# Altium footprint library JEDEC_G.PcbLib: 194 footprints (part 1 of 13)
Each footprint in its own frame and in the unit in brackets; x right, y up, seen from the top. Pads: shape width x height; smd on the part's side, far side on the other; paste and mask are expansions set on the pad; w line width, h text height; cw(c..) or ccw(c..) is an arc to the next point about the centre after c.
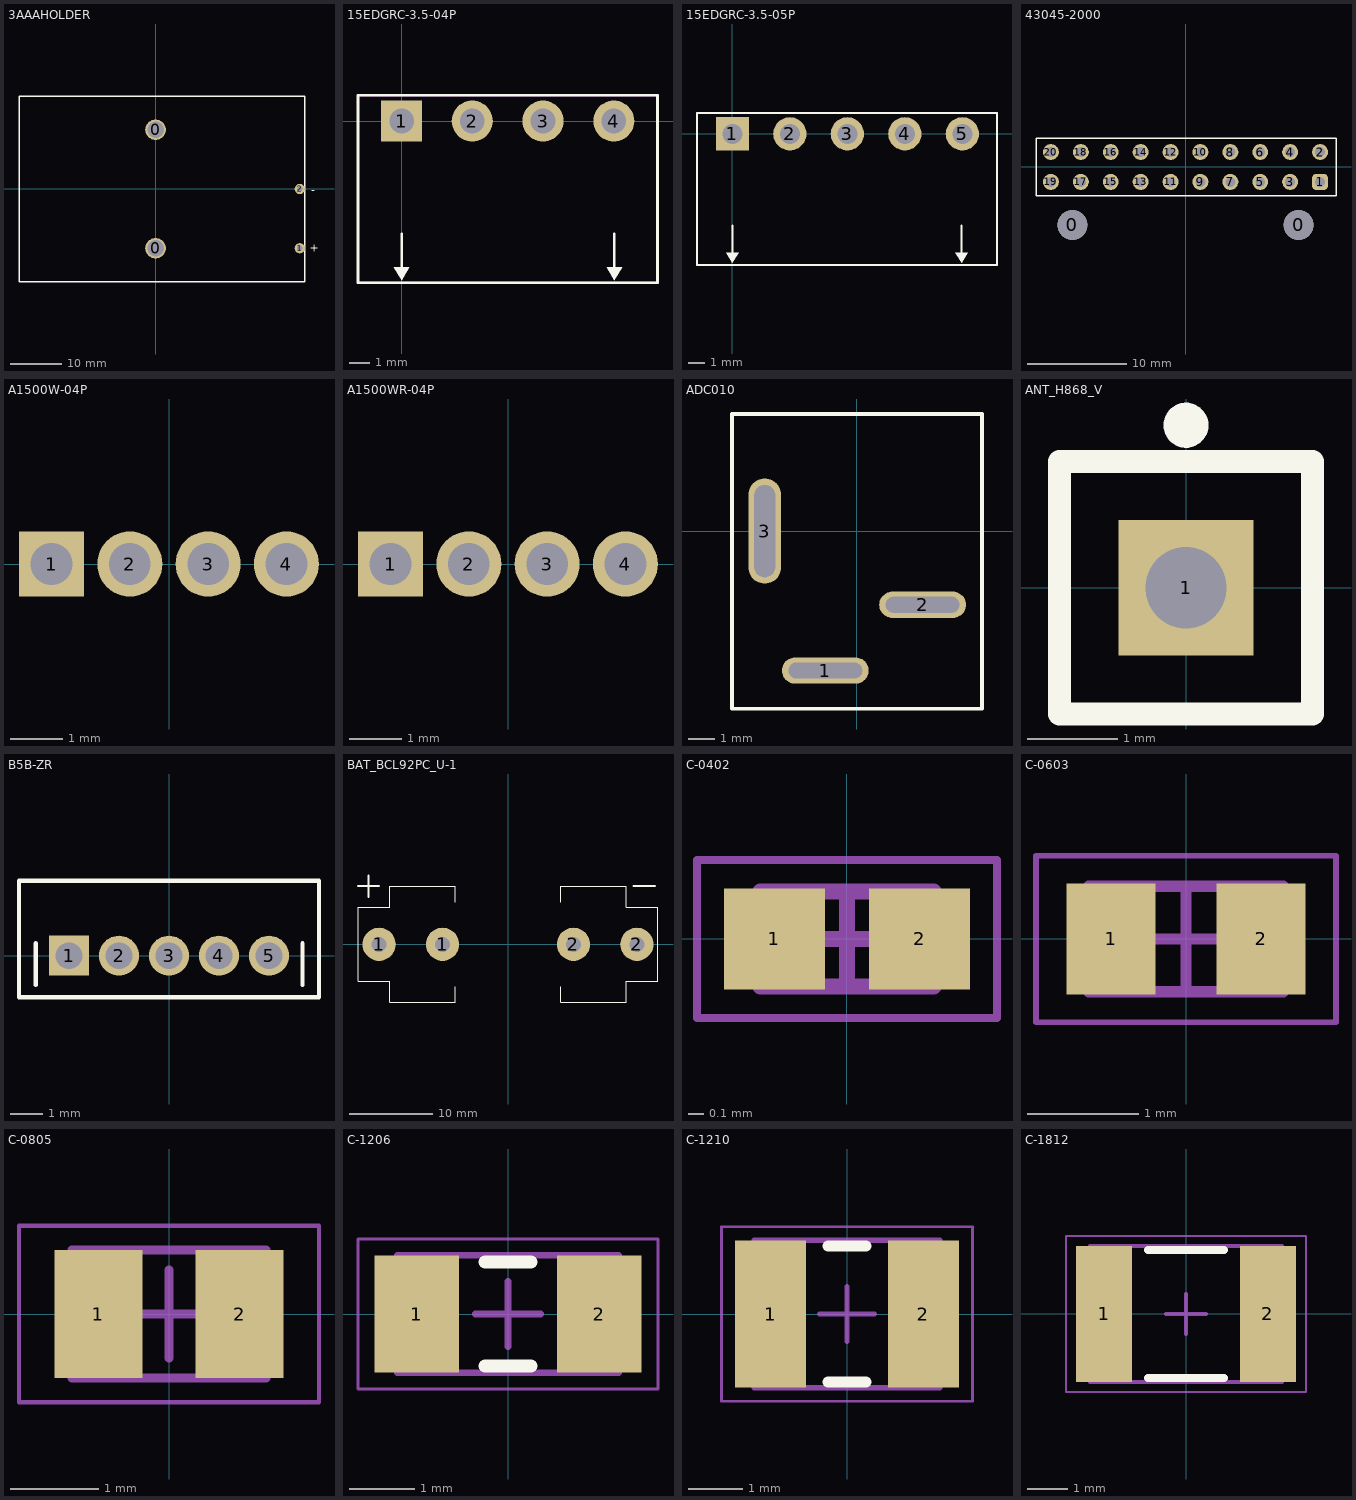
[diagram p0: the footprints below, top view; thin cyan lines are the x and y axes]

## 3AAAHOLDER [mm]
pads (4):
  round 4 hole 3.2: 0(0,-11.5) 0(0,11.5)
  round 2 hole 1: 1(28,-11.5) 2(28,0)
Top Overlay:
  lines w0.254: -26.5,-18 -26.5,18 29,18 29,-18 -26.5,-18
  text "-" at 30.2,-0.9 h1.52
  text "+" at 29.9,-12.2 h1.52
3D body "3x AAA battery holder_update.stp": height 13, standoff 0, extent -26.188,-18 26.795,18

## 15EDGRC-3.5-04P [mil]
pads (4):
  rect 80x80 hole 48: 1(0,0)
  round 80 hole 48: 2(137.8,0) 3(275.8,0) 4(413.8,0)
Top Overlay:
  region: 0,-310 -15,-285 15,-285
  region: 415,-310 400,-285 430,-285
  lines w5: 0,-285 0,-220 ; 415,-285 415,-220 ; 498,50 -85,50 -85,-315 499,-315 499,50
Mechanical 1:
  lines w3.94: -85,-315 -85,50 500,50 500,-315 -85,-315
3D body "15EDGRC-3_5-04P.step": height 283.46, standoff -133.86, extent -84.64,-314.96 498.04,47.25

## 15EDGRC-3.5-05P [mil]
pads (5):
  rect 80x80 hole 48: 1(0,0)
  round 80 hole 48: 2(137.8,0) 3(275.8,0) 4(413.8,0) 5(551.8,0)
Top Overlay:
  region: 550,-310 535,-285 565,-285
  region: 0,-310 -15,-285 15,-285
  lines w5: 0,-285 0,-220 ; 550,-285 550,-220 ; -85,-315 -85,50 635,50 635,-315 -85,-315
Mechanical 1:
  lines w3.94: -85,15 -85,25 ; -85,-315 -85,50 635,50 635,-315 -85,-315
3D body "15EDGRC-3_5-03P.STEP": height 283.46, standoff -133.86, extent 190.95,-314.95 633.86,47.25
3D body "15EDGRC-3_5-2.step": height 283.46, standoff -133.86, extent -88.58,-312.21 218.51,50

## 43045-2000 [mm] "Molex micro-fit connector, 20 pins"
pads (22):
  round 3 hole 3 unplated: 0(-11.35,-5.82) 0(11.35,-5.82)
  rrect50% 1.6x1.6 hole 1: 1(13.5,-1.5)
  round 1.6 hole 1: 2(13.5,1.5) 3(10.5,-1.5) 4(10.5,1.5) 5(7.5,-1.5) 6(7.5,1.5) 7(4.5,-1.5) 8(4.5,1.5) 9(1.5,-1.5) 10(1.5,1.5) 11(-1.5,-1.5) 12(-1.5,1.5) 13(-4.5,-1.5) 14(-4.5,1.5) 15(-7.5,-1.5) 16(-7.5,1.5) 17(-10.5,-1.5) 18(-10.5,1.5) 19(-13.5,-1.5) 20(-13.5,1.5)
Top Overlay:
  lines w0.15: -15,-2.9 -15,2.9 15.1,2.9 15.1,-2.9 -15,-2.9
3D body "Molex43045-2000.step": height 8.83, standoff -3.12, extent -17.075,-10.45 17.075,1.79

## A1500W-04P [mm] "1.5 mm pitch pcb male"
pads (4):
  rect 1.25x1.25 hole 0.8: 1(-2.25,0)
  round 1.25 hole 0.8: 2(-0.75,0) 3(0.75,0) 4(2.25,0)
3D body "B4B-ZR.STEP": height 4.5, standoff -2.7, extent -3.75,-1.27 3.75,2.23

## A1500WR-04P [mm] "1.5 mm pitch right angle pcb male"
pads (4):
  rect 1.25x1.25 hole 0.8: 1(-2.25,0)
  round 1.25 hole 0.8: 2(-0.75,0) 3(0.75,0) 4(2.25,0)
3D body "S4B-ZR.STEP": height 3.81, standoff -2.59, extent -3.75,-4.5 3.75,1.5

## ADC010 [mm] "DC power jack, 2mm, vertical"
pads (3):
  oval 3.3x1 hole 0.6 slot 2.8 at 0 deg mask+0.1: 1(-1.2,-5.3) 2(2.5,-2.8)
  oval 1.25x4 hole 0.8 slot 3.5 at 90 deg mask+0.1: 3(-3.5,0)
Top Overlay:
  lines w0.15: -4.75,-6.75 -4.75,4.45 4.75,4.45 4.75,-6.75 -4.75,-6.75
3D body "pj-006b.stp": height 13.2, standoff -4.8, extent -4.35,-6.4 4.35,4.3

## ANT_H868_V [mm] "helical 868 MHz antenna"
pads (1):
  rect 1.5x1.5 hole 0.9: 1(0,0)
Top Overlay:
  circle w0.25: c0,1.8 r0.125
  lines w0.254: -1.4,-1.4 1.4,-1.4 1.4,1.4 -1.4,1.4 -1.4,-1.4
3D body "868mhz_antenna.STEP": height 16.4, standoff -1.37, extent -5.9,-4.25 0.4,2.05

## B5B-ZR [mil]
pads (5):
  rect 48x48 hole 32: 1(-120,0)
  round 48 hole 32: 2(-60,0) 3(0,0) 4(60,0) 5(120,0)
Top Overlay:
  lines w5: -160,-35 -160,15 ; 160,-35 160,15 ; -180,-50 180,-50 180,90 -180,90 -180,-50
3D body "B5B-ZR.STEP": height 86.61, standoff -196.85, extent -177.17,-50 177.16,87.79

## BAT_BCL92PC_U-1 [mm]
pads (4):
  round 4 hole 1.8: 1(-15.494,0) 1(-7.874,0) 2(7.874,0) 2(15.494,0)
Top Overlay:
  lines w0.127: -6.35,-5.08 -6.35,-6.985 -14.224,-6.985 -14.224,-4.445 -18.034,-4.445 -18.034,4.445 -14.224,4.445 -14.224,6.985 -6.35,6.985 -6.35,5.08 ; 6.35,-5.08 6.35,-6.985 14.224,-6.985 14.224,-4.445 18.034,-4.445 18.034,4.445 14.224,4.445 14.224,6.985 6.35,6.985 6.35,5.08
  lines w0.25: -18.034,6.985 -15.494,6.985 ; -16.764,5.715 -16.764,8.255 ; 15.113,6.985 17.653,6.985
3D body "BATH_KEYSTONE_92.stp": height 15.13, standoff -3.81, extent -17.381,-6.726 -7.848,6.726
3D body "BATH_KEYSTONE_92.stp": height 15.13, standoff -3.81, extent 7.848,-6.726 17.381,6.726

## C-0402 [mm] "Chip Capacitor, 2-Leads, Body 1,00x0,50mm, IPC Medium Density"
height 0.6
pads (2):
  rect 0.64x0.64 smd: 1(-0.46,0) 2(0.46,0)
Mechanical 13:
  lines w0.1: -0.55,-0.3 0.55,-0.3 0.55,0.3 -0.55,0.3 -0.55,-0.3
Mechanical 15:
  lines w0.05: -0.95,-0.5 0.95,-0.5 0.95,0.5 -0.95,0.5 -0.95,-0.5
  lines w0.1: -0.3,0 0.3,0 ; 0,-0.3 0,0.3
3D body "C_0402_1005Metric.step": height 0.5, standoff 0, extent -0.5,-0.25 0.5,0.25

## C-0603 [mm] "Chip Capacitor, 2-Leads, Body 1,60x0,80mm, IPC Medium Density"
height 0.85
pads (2):
  rect 0.8x1 smd: 1(-0.675,0) 2(0.675,0)
Mechanical 13:
  lines w0.1: -0.875,-0.475 0.875,-0.475 0.875,0.475 -0.875,0.475 -0.875,-0.475
Mechanical 15:
  lines w0.05: -1.35,-0.75 1.35,-0.75 1.35,0.75 -1.35,0.75 -1.35,-0.75
  lines w0.1: -0.475,0 0.475,0 ; 0,-0.475 0,0.475
3D body "C_0603_1608Metric.step": height 0.8, standoff 0, extent -0.8,-0.4 0.8,0.4

## C-0805 [mm] "Chip Capacitor, 2-Leads, Body 2,00x1,25mm, IPC Medium Density"
height 1.1
pads (2):
  rect 1x1.45 smd: 1(-0.8,0) 2(0.8,0)
Mechanical 13:
  lines w0.1: -1.1,-0.725 -1.1,0.725 1.1,0.725 1.1,-0.725 -1.1,-0.725
Mechanical 15:
  lines w0.05: -1.7,-1 -1.7,1 1.7,1 1.7,-1 -1.7,-1
  lines w0.1: -0.5,0 0.5,0 ; 0,-0.5 0,0.5
3D body "C_0805_2012Metric.step": height 1.25, standoff 0, extent -1,-0.625 1,0.625

## C-1206 [mm] "Chip Capacitor, 2-Leads, Body 3,20x1,60mm, IPC Medium Density"
height 1.35
pads (2):
  rect 1.3x1.8 smd: 1(-1.4,0) 2(1.4,0)
Top Overlay:
  lines w0.2: -0.35,-0.8 0.35,-0.8 ; -0.35,0.8 0.35,0.8
Mechanical 13:
  lines w0.1: -1.7,-0.9 1.7,-0.9 1.7,0.9 -1.7,0.9 -1.7,-0.9
Mechanical 15:
  lines w0.05: -2.3,-1.15 2.3,-1.15 2.3,1.15 -2.3,1.15 -2.3,-1.15
  lines w0.1: -0.5,0 0.5,0 ; 0,-0.5 0,0.5
3D body "C_1206_3216Metric.step": height 1.6, standoff 0, extent -1.6,-0.8 1.6,0.8

## C-1210 [mm] "Chip Capacitor, 2-Leads, Body 3,20x2,50mm, IPC Medium Density"
height 1.35
pads (2):
  rect 1.3x2.7 smd: 1(-1.4,0) 2(1.4,0)
Top Overlay:
  lines w0.2: -0.35,-1.25 0.35,-1.25 ; -0.35,1.25 0.35,1.25
Mechanical 13:
  lines w0.1: -1.7,-1.35 1.7,-1.35 1.7,1.35 -1.7,1.35 -1.7,-1.35
Mechanical 15:
  lines w0.05: -2.3,-1.6 2.3,-1.6 2.3,1.6 -2.3,1.6 -2.3,-1.6
  lines w0.1: -0.5,0 0.5,0 ; 0,-0.5 0,0.5
3D body "C_1210_3225Metric.step": height 2.5, standoff 0, extent -1.6,-1.25 1.6,1.25

## C-1812 [mm] "Chip Capacitor, 2-Leads, Body 4,50x3,20mm, IPC Medium Density"
height 1.35
pads (2):
  rect 1.4x3.4 smd: 1(-2.05,0) 2(2.05,0)
Top Overlay:
  lines w0.2: -0.95,-1.6 0.95,-1.6 ; -0.95,1.6 0.95,1.6
Mechanical 13:
  lines w0.1: -2.4,-1.7 -2.4,1.7 2.4,1.7 2.4,-1.7 -2.4,-1.7
Mechanical 15:
  lines w0.05: -3,-1.95 -3,1.95 3,1.95 3,-1.95 -3,-1.95
  lines w0.1: -0.5,0 0.5,0 ; 0,-0.5 0,0.5
3D body "C_1812_4532Metric.step": height 2.5, standoff 0, extent -2.25,-1.6 2.25,1.6